# Altium footprint library LimeMicroAltiumLib_pcbLib_r01.PcbLib: 434 footprints (part 4 of 29)
Each footprint in its own frame and in the unit in brackets; x right, y up, seen from the top. Pads: shape width x height; smd on the part's side, far side on the other; paste and mask are expansions set on the pad; w line width, h text height; cw(c..) or ccw(c..) is an arc to the next point about the centre after c.
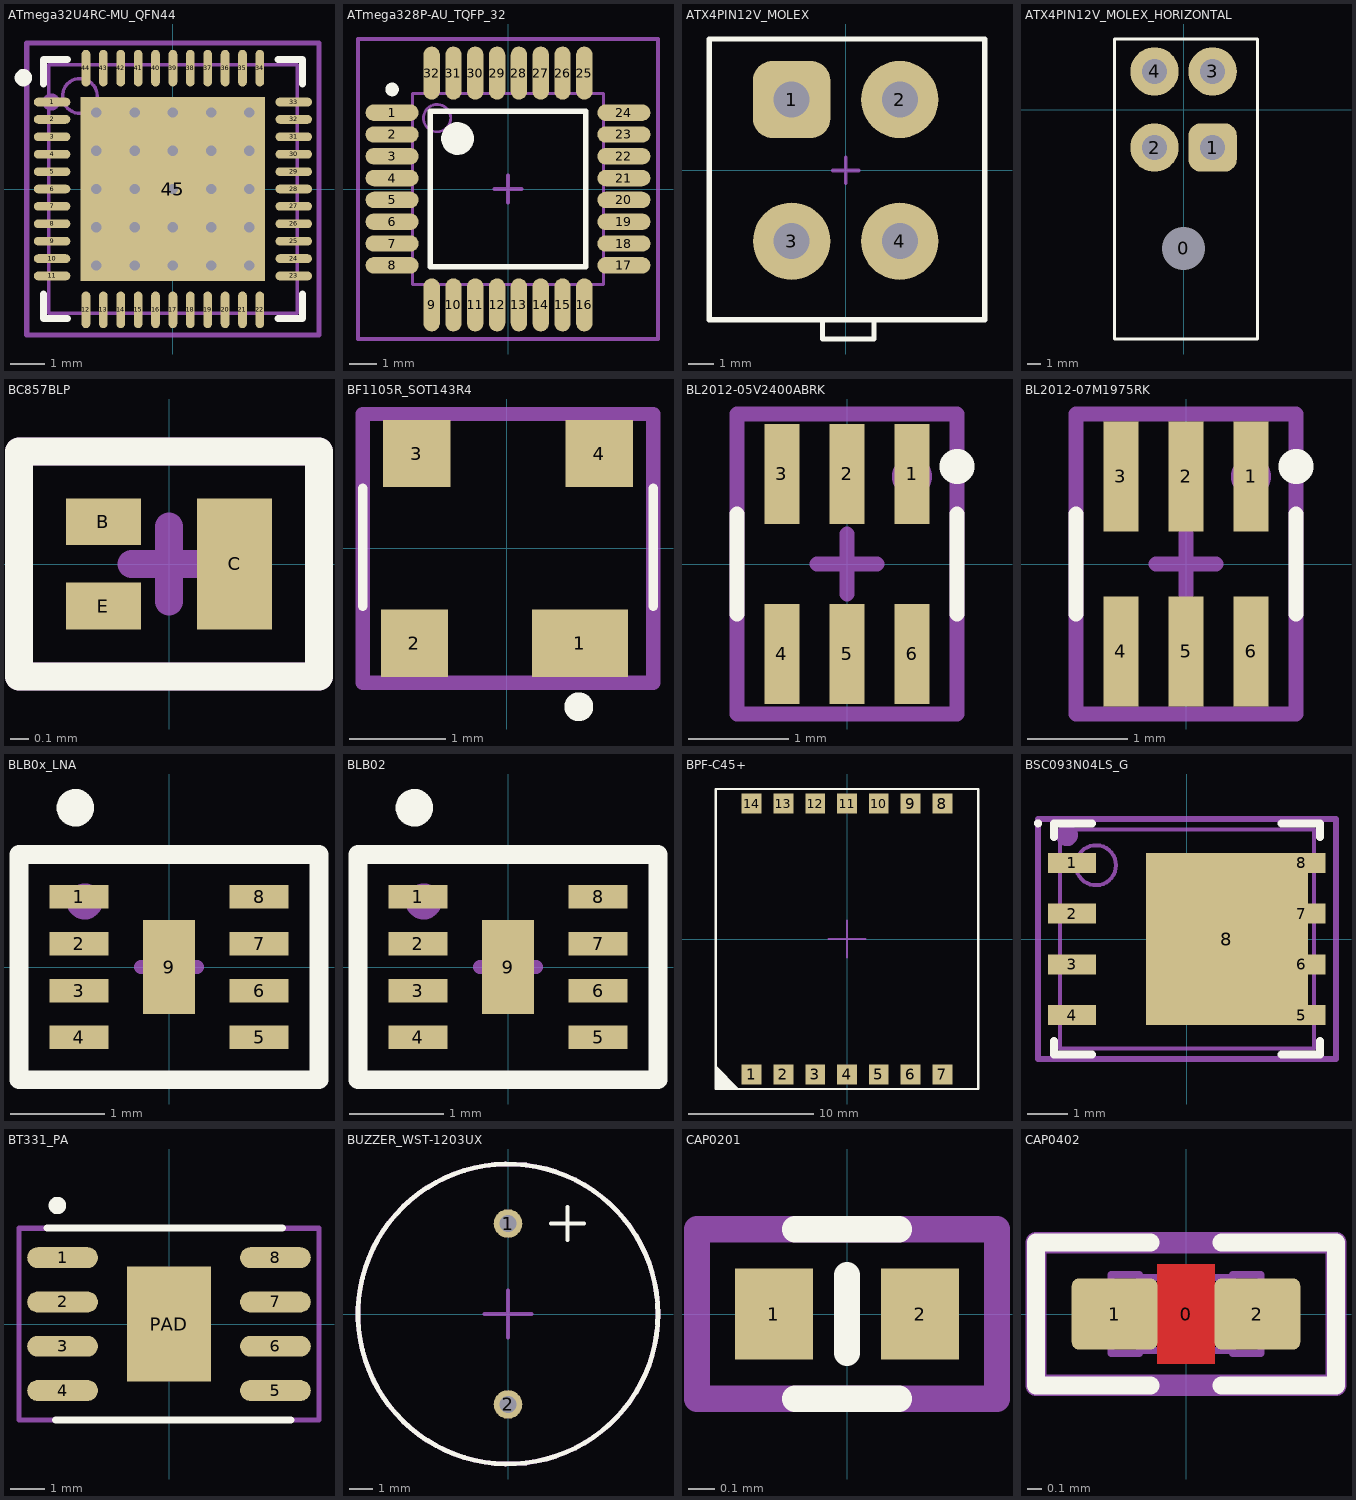
[diagram p3: the footprints below, top view; thin cyan lines are the x and y axes]

## ATmega32U4RC-MU_QFN44 [mm] "QFN, 44-Leads, Body 7x7mm, Pitch 0.5mm, Thermal Pad 5.3x5.3mm, IPC Low Density"
height 0.9
pads (45):
  oval 1.05x0.25 smd mask+0.05: 1(-3.475,2.5) 2(-3.475,2) 3(-3.475,1.5) 4(-3.475,1) 5(-3.475,0.5) 6(-3.475,0) 7(-3.475,-0.5) 8(-3.475,-1) 9(-3.475,-1.5) 10(-3.475,-2) 11(-3.475,-2.5) 23(3.475,-2.5) 24(3.475,-2) 25(3.475,-1.5) 26(3.475,-1) 27(3.475,-0.5) 28(3.475,0) 29(3.475,0.5) 30(3.475,1) 31(3.475,1.5) 32(3.475,2) 33(3.475,2.5)
  oval 0.25x1.05 smd mask+0.05: 12(-2.5,-3.475) 13(-2,-3.475) 14(-1.5,-3.475) 15(-1,-3.475) 16(-0.5,-3.475) 17(0,-3.475) 18(0.5,-3.475) 19(1,-3.475) 20(1.5,-3.475) 21(2,-3.475) 22(2.5,-3.475) 34(2.5,3.475) 35(2,3.475) 36(1.5,3.475) 37(1,3.475) 38(0.5,3.475) 39(0,3.475) 40(-0.5,3.475) 41(-1,3.475) 42(-1.5,3.475) 43(-2,3.475) 44(-2.5,3.475)
  rect 5.3x5.3 smd mask+0.05: 45(0,0)
via 2.2,-2.2 diameter 0.6 hole 0.3
via 1.1,-2.2 diameter 0.6 hole 0.3
via 0,-2.2 diameter 0.6 hole 0.3
via -1.1,-2.2 diameter 0.6 hole 0.3
via -2.2,-2.2 diameter 0.6 hole 0.3
via 2.2,-1.1 diameter 0.6 hole 0.3
via 1.1,-1.1 diameter 0.6 hole 0.3
via 0,-1.1 diameter 0.6 hole 0.3
via -1.1,-1.1 diameter 0.6 hole 0.3
via -2.2,-1.1 diameter 0.6 hole 0.3
via 2.2,0 diameter 0.6 hole 0.3
via 1.1,0 diameter 0.6 hole 0.3
via 0,0 diameter 0.6 hole 0.3
via -1.1,0 diameter 0.6 hole 0.3
via -2.2,0 diameter 0.6 hole 0.3
via 2.2,1.1 diameter 0.6 hole 0.3
via 1.1,1.1 diameter 0.6 hole 0.3
via 0,1.1 diameter 0.6 hole 0.3
via -1.1,1.1 diameter 0.6 hole 0.3
via -2.2,1.1 diameter 0.6 hole 0.3
via 2.2,2.2 diameter 0.6 hole 0.3
via 1.1,2.2 diameter 0.6 hole 0.3
via 0,2.2 diameter 0.6 hole 0.3
via -1.1,2.2 diameter 0.6 hole 0.3
via -2.2,2.2 diameter 0.6 hole 0.3
Top Overlay:
  circle w0.25: c-4.3,3.2 r0.125
  lines w0.2: -3.725,-3.025 -3.725,-3.725 -3.025,-3.725 ; -3.725,3.025 -3.725,3.725 -3.025,3.725 ; 3.025,-3.725 3.725,-3.725 3.725,-3.025 ; 3.025,3.725 3.725,3.725 3.725,3.025
Mechanical 13:
  circle w0.1: c-2.675,2.675 r0.5
  lines w0.1: -3.575,-3.575 3.575,-3.575 3.575,3.575 -3.575,3.575 -3.575,-3.575
Mechanical 15:
  circle w0.3: c-3.5,2.5 r0.1
  lines w0.15: -0.5,0 0.5,0 ; 0,-0.5 0,0.5 ; -4.2,-4.2 4.2,-4.2 4.2,4.2 -4.2,4.2 -4.2,-4.2
  text ".Designator" at 0,0 h0.55
3D body "User Library-QFN 44.step": height 0.8, standoff -0.05, extent -3.501,-3.501 3.501,3.501

## ATmega328P-AU_TQFP_32 [mm] "Thin QFP, 32-Leads, Body 7x7mm, Pitch 0.8mm, IPC Low Density"
height 1.2
pads (32):
  oval 1.95x0.6 smd mask+0.05: 1(-4.25,2.8) 2(-4.25,2) 3(-4.25,1.2) 4(-4.25,0.4) 5(-4.25,-0.4) 6(-4.25,-1.2) 7(-4.25,-2) 8(-4.25,-2.8) 17(4.25,-2.8) 18(4.25,-2) 19(4.25,-1.2) 20(4.25,-0.4) 21(4.25,0.4) 22(4.25,1.2) 23(4.25,2) 24(4.25,2.8)
  oval 0.6x1.95 smd mask+0.05: 9(-2.8,-4.25) 10(-2,-4.25) 11(-1.2,-4.25) 12(-0.4,-4.25) 13(0.4,-4.25) 14(1.2,-4.25) 15(2,-4.25) 16(2.8,-4.25) 25(2.8,4.25) 26(2,4.25) 27(1.2,4.25) 28(0.4,4.25) 29(-0.4,4.25) 30(-1.2,4.25) 31(-2,4.25) 32(-2.8,4.25)
Top Overlay:
  circle w0.6: c-1.85,1.85 r0.3
  circle w0.25: c-4.25,3.65 r0.125
  lines w0.2: -2.85,-2.85 2.85,-2.85 2.85,2.85 -2.85,2.85 -2.85,-2.85
Mechanical 13:
  circle w0.1: c-2.6,2.6 r0.5
  lines w0.1: -3.5,-3.5 3.5,-3.5 3.5,3.5 -3.5,3.5 -3.5,-3.5
Mechanical 15:
  circle w0.3: c-4.25,2.75 r0.112
  lines w0.15: -0.5,0 0.5,0 ; 0,-0.5 0,0.5 ; -5.5,-5.5 5.5,-5.5 5.5,5.5 -5.5,5.5 -5.5,-5.5
  text ".Designator" at 0,0 h0.55
3D body "User Library-TQFP32-4.step": height 1.1, standoff -0.05, extent -4.512,-4.512 4.512,4.512

## ATX4PIN12V_MOLEX [mm]
pads (4):
  rrect50% 3x3 hole 1.4: 1(-2.1,2.75)
  round 3 hole 1.4: 2(2.1,2.75) 3(-2.1,-2.75) 4(2.1,-2.75)
Top Overlay:
  lines w0.2: -0.9,-5.85 -0.9,-6.55 1.1,-6.55 1.1,-5.85 ; -5.3,-5.8 -5.3,5.1 5.4,5.1 5.4,-5.8 -5.3,-5.8
Mechanical 15:
  lines w0.15: -0.9,-5.85 -0.9,-6.55 1.1,-6.55 1.1,-5.85 ; -0.5,0 0.5,0 ; 0,-0.5 0,0.5 ; -5.3,-5.8 5.4,-5.8 5.4,5.1 -5.3,5.1 -5.3,-5.8
  text ".Designator" at 0,0.025 h0.55
3D body "039281043.stp": height 12.8, standoff -3.5, extent -5.2,-6 5.2,5

## ATX4PIN12V_MOLEX_HORIZONTAL [mm]
pads (5):
  round 3 hole 3.1: 0(0,-10.05)
  rrect50% 3.5x3.5 hole 1.8: 1(2.1,-2.75)
  round 3.5 hole 1.8: 2(-2.1,-2.75) 3(2.1,2.75) 4(-2.1,2.75)
Top Overlay:
  lines w0.2: -5,-16.6 -5,5.1 5.35,5.1 5.35,-16.6 -5,-16.6
Mechanical 15:
  lines w0.15: -5,-16.6 5.35,-16.6 5.35,5.1 -5,5.1 -5,-16.6
  text ".Designator" at -0.1,-0.25 h0.55
3D body "039301041.stp": height 11.4, standoff -3.6, extent -4.8,-16.668 5.2,3.268

## BC857BLP [mm]
pads (3):
  rect 0.4x0.25 smd mask+0.05: B(-0.35,0.225) E(-0.35,-0.225)
  rect 0.4x0.7 smd mask+0.05: C(0.35,0)
Top Overlay:
  lines w0.15: -0.8,-0.6 -0.8,0.6 0.8,0.6 0.8,-0.6 -0.8,-0.6
Mechanical 15:
  lines w0.15: -0.2,0 0.2,0 ; 0,-0.2 0,0.2 ; -0.8,-0.6 0.8,-0.6 0.8,0.6 -0.8,0.6 -0.8,-0.6
  text ".Designator" at 0,0 h0.55
3D body: height 0.5, standoff 0, extent -0.5,-0.3 0.5,0.3

## BF1105R_SOT143R4 [mm] "RF MOSFET Transistors Trans MOSFET N-CH 7V 0.03A 4pin(3+Tab). SOT-143R-4 package"
pads (4):
  rect 1x0.7 smd: 1(0.763,-0.987)
  rect 0.7x0.7 smd: 2(-0.962,-0.987) 3(-0.937,0.988) 4(0.963,0.988)
Top Overlay:
  circle w0.15: c0.75,-1.65 r0.075
  lines w0.1: -1.5,-0.6 -1.5,0.625 ; 1.525,-0.6 1.525,0.625
Mechanical 15:
  circle w0.15: c0.75,-0.975 r0.056
  lines w0.15: -1.5,-1.4 1.525,-1.4 1.525,1.4 -1.5,1.4 -1.5,-1.4
  text ".Designator" at 0,0 h0.55
3D body "User Library-SOT143R.STEP": height 0.95, standoff 0.02, extent -1.438,-1.262 1.463,1.238

## BL2012-05V2400ABRK [mm]
pads (6):
  rect 0.35x1 smd mask+0.05: 1(0.65,0.9) 2(0,0.9) 3(-0.65,0.9) 4(-0.65,-0.9) 5(0,-0.9) 6(0.65,-0.9)
Top Overlay:
  circle w0.3: c1.1,0.975 r0.025
  lines w0.15: -1.1,-0.5 -1.1,0.5 ; 1.1,-0.5 1.1,0.5
Mechanical 15:
  circle w0.3: c0.65,0.875 r0.05
  lines w0.15: -0.3,0 0.3,0 ; 0,-0.3 0,0.3 ; -1.1,-1.5 1.1,-1.5 1.1,1.5 -1.1,1.5 -1.1,-1.5
  text ".Designator" at 0,0 h0.55
3D body: height 0.96, standoff 0, extent 0.5,-1.037 0.8,-0.725
3D body: height 0.96, standoff 0, extent -0.15,-1.037 0.15,-0.725
3D body: height 0.96, standoff 0, extent -0.8,-1.037 -0.5,-0.725
3D body: height 0.96, standoff 0, extent -0.8,0.725 -0.5,1.037
3D body: height 0.96, standoff 0, extent -0.15,0.725 0.15,1.037
3D body: height 0.96, standoff 0, extent 0.4,-0.2 0.8,0.2
3D body: height 0.96, standoff 0, extent 0.5,0.725 0.8,1.037
3D body: height 0.95, standoff 0, extent -1,-1 1,1

## BL2012-07M1975RK [mm]
pads (6):
  rect 0.35x1.1 smd mask+0.05: 1(0.65,0.875) 2(0,0.875) 3(-0.65,0.875) 4(-0.65,-0.875) 5(0,-0.875) 6(0.65,-0.875)
Top Overlay:
  circle w0.3: c1.1,0.975 r0.025
  lines w0.15: -1.1,-0.5 -1.1,0.5 ; 1.1,-0.5 1.1,0.5
Mechanical 15:
  circle w0.3: c0.65,0.875 r0.05
  lines w0.15: -0.3,0 0.3,0 ; 0,-0.3 0,0.3 ; -1.1,-1.5 1.1,-1.5 1.1,1.5 -1.1,1.5 -1.1,-1.5
  text ".Designator" at 0,0 h0.55
3D body: height 0.96, standoff 0, extent 0.338,-0.125 0.613,0.125
3D body: height 0.96, standoff 0, extent 0.5,0.512 0.8,0.637
3D body: height 0.96, standoff 0, extent -0.8,0.513 -0.5,0.638
3D body: height 0.96, standoff 0, extent -0.15,0.512 0.15,0.637
3D body: height 0.96, standoff 0, extent 0.5,-0.637 0.8,-0.512
3D body: height 0.96, standoff 0, extent -0.15,-0.637 0.15,-0.512
3D body: height 0.96, standoff 0, extent -0.8,-0.637 -0.5,-0.512
3D body: height 0.95, standoff 0, extent -1,-0.625 1,0.625

## BLB0x_LNA [mm] "BLB01 and BLB02 footprint"
pads (9):
  rect 0.625x0.25 smd mask+0.05: 1(-0.96,0.75) 2(-0.96,0.25) 3(-0.96,-0.25) 4(-0.96,-0.75) 5(0.96,-0.75) 6(0.96,-0.25) 7(0.96,0.25) 8(0.96,0.75)
  rect 0.56x1 smd mask+0.05: 9(0,0)
Top Overlay:
  circle w0.2: c-1,1.7 r0.1
  lines w0.2: -1.6,-1.2 1.6,-1.2 1.6,1.2 -1.6,1.2 -1.6,-1.2
Mechanical 15:
  circle w0.254: c-0.9,0.7 r0.064
  lines w0.15: -0.3,0 0.3,0 ; 0,-0.3 0,0.3 ; -1.6,-1.2 -1.6,1.2 1.6,1.2 1.6,-1.2 -1.6,-1.2
  text ".Designator" at 0,0 h0.55
3D body: height 0.6, standoff 0, extent -1.1,-1.1 1.1,1.1
3D body: height 0.61, standoff 0, extent -0.949,0.65 -0.65,0.95

## BLB02 [mm]
pads (9):
  rect 0.625x0.25 smd mask+0.05: 1(-0.96,0.75) 2(-0.96,0.25) 3(-0.96,-0.25) 4(-0.96,-0.75) 5(0.96,-0.75) 6(0.96,-0.25) 7(0.96,0.25) 8(0.96,0.75)
  rect 0.56x1 smd mask+0.05: 9(0,0)
Top Overlay:
  circle w0.2: c-1,1.7 r0.1
  lines w0.2: -1.6,-1.2 1.6,-1.2 1.6,1.2 -1.6,1.2 -1.6,-1.2
Mechanical 15:
  circle w0.254: c-0.9,0.7 r0.064
  lines w0.15: -0.3,0 0.3,0 ; 0,-0.3 0,0.3 ; -1.6,-1.2 -1.6,1.2 1.6,1.2 1.6,-1.2 -1.6,-1.2
  text ".Designator" at 0,0 h0.55
3D body: height 0.6, standoff 0, extent -1.1,-1.1 1.1,1.1
3D body: height 0.61, standoff 0, extent -0.949,0.65 -0.65,0.95

## BPF-C45+ [mm]
height 6.35
pads (14):
  rect 1.6x1.6 smd mask+0.05: 1(-7.62,-10.83) 2(-5.08,-10.83) 3(-2.54,-10.83) 4(0,-10.83) 5(2.54,-10.83) 6(5.08,-10.83) 7(7.62,-10.83) 8(7.62,10.83) 9(5.08,10.83) 10(2.54,10.83) 11(0,10.83) 12(-2.54,10.83) 13(-5.08,10.83) 14(-7.62,10.83)
Top Overlay:
  region: -10.5,-10.1 -10.5,-12 -8.6,-12
  lines w0.2: -10.5,-12 -10.5,12 10.5,12 10.5,-12 -10.5,-12
Mechanical 15:
  circle w0.3: c-7.6,-10.8 r0.141
  lines w0.15: -1.5,0 0,0 ; 0,-1.5 0,0 ; 0,1.5 0,0 ; 1.5,0 0,0 ; -10.5,-12 10.5,-12 10.5,12 -10.5,12 -10.5,-12
  text ".Designator" at 0,0 h0.55
3D body: height 6.35, standoff 0, extent -10.15,-11.05 10.15,11.05

## BSC093N04LS_G [mm] "SON, 8-Leads, Body 5,32x6,15mm, Pitch 1,27mm, Thermal Pad 3,60x4,05mm, IPC Medium Density"
height 1.1
pads (9):
  rect 1.2x0.5 smd: 1(-2.87,1.905) 2(-2.87,0.635) 3(-2.87,-0.635) 4(-2.87,-1.905) 5(2.87,-1.905) 6(2.87,-0.635) 7(2.87,0.635) 8(2.87,1.905)
  rect 4.05x4.3 smd paste-2.025: 8(1,0)
Top Overlay:
  circle w0.1: c-3.725,2.895 r0.05
  lines w0.2: -3.325,-2.555 -3.325,-2.895 -2.37,-2.895 ; -3.325,2.555 -3.325,2.895 -2.37,2.895 ; 2.37,-2.895 3.325,-2.895 3.325,-2.555 ; 2.37,2.895 3.325,2.895 3.325,2.555
Mechanical 13:
  circle w0.1: c-2.275,1.845 r0.5
  lines w0.1: -3.175,-2.745 3.175,-2.745 3.175,2.745 -3.175,2.745 -3.175,-2.745
Mechanical 15:
  circle w0.35: c-3,2.6 r0.1
  lines w0.15: -0.5,0 0.5,0 ; 0,-0.5 0,0.5 ; -3.73,-3 3.73,-3 3.73,3 -3.73,3 -3.73,-3
  text ".Designator" at 0,0 h0.55
3D body: height 1.1, standoff 0.2, extent -3.175,-2.745 3.175,2.745

## BT331_PA [mm] "Berex BT331 RF PA"
pads (9):
  oval 2.03x0.6 smd mask+0.05: 1(-3.05,1.905) 2(-3.05,0.635) 3(-3.05,-0.635) 4(-3.05,-1.905) 5(3.05,-1.905) 6(3.05,-0.635) 7(3.05,0.635) 8(3.05,1.905)
  rect 2.41x3.3 smd mask+0.05: PAD(0,0)
Top Overlay:
  circle w0.3: c-3.2,3.4 r0.1
  lines w0.2: -3.5,2.75 3.25,2.75 ; -3.25,-2.75 3.5,-2.75
Mechanical 15:
  circle w0.3: c-3.15,1.925 r0.103
  lines w0.15: -0.5,0 0.5,0 ; 0,-0.5 0,0.5 ; -4.3,-2.75 4.3,-2.75 4.3,2.75 -4.3,2.75 -4.3,-2.75
  text ".Designator" at 0,0 h0.55
3D body "SOIC-8.STEP": height 1.75, standoff 0, extent -3,-2.45 3,2.45

## BUZZER_WST-1203UX [mm]
pads (2):
  round 1.2 hole 0.7 mask+0.05: 1(0,3.8) 2(0,-3.8)
Top Overlay:
  circle w0.2: c0,0 r6.3
  lines w0.15: 1.8,3.8 3.2,3.8 ; 2.5,3.1 2.5,4.5
Mechanical 15:
  circle w0.2: c0,0 r6.301
  lines w0.15: -1,0 0,0 ; 0,-1 0,0 ; 0,1 0,0 ; 1,0 0,0
  text ".Designator" at 0,0 h0.55
  text "positive (longer pin)" at -5.3,2.4 h0.55
3D body "User Library-WST-1203UX.step": height 9.65, standoff -4.5, extent -6,-6.027 6,9.427

## CAP0201 [mm]
pads (2):
  rect 0.3x0.35 smd mask+0.05: 1(-0.28,0) 2(0.28,0)
Top Overlay:
  lines w0.1: -0.2,-0.325 0.2,-0.325 ; -0.2,0.325 0.2,0.325 ; 0,-0.15 0,0.15
Mechanical 15:
  circle w0.05: c0,0 r0.025
  lines w0.1: -0.575,-0.325 -0.575,0.325 0.575,0.325 0.575,-0.325 -0.575,-0.325
  text ".Designator" at 0,0 h0.55
3D body: height 0.25, standoff 0, extent 0.17,-0.15 0.3,0.15
3D body: height 0.25, standoff 0, extent -0.3,-0.15 -0.17,0.15
3D body: height 0.25, standoff 0, extent -0.17,-0.15 0.17,0.15

## CAP0402 [mm] "Chip Capacitor, Body 1.0x0.5mm, 0402, IPC Medium Density"
height 0.55
pads (3):
  round 0.2 on Mech15: 0(0,0)
  rrect20% 0.6x0.5 smd: 1(-0.5,0) 2(0.5,0)
Top Layer:
  pour cut-out: -0.2,0.35 0.2,0.35 0.2,-0.35 -0.2,-0.35
Top Overlay:
  lines w0.127: -0.25,-0.5 -1.05,-0.5 -1.05,0.5 -0.25,0.5 ; 0.25,-0.5 1.05,-0.5 1.05,0.5 0.25,0.5
Mechanical 13:
  lines w0.05: -0.325,-0.255 0.325,-0.255 ; -0.325,0.255 0.325,0.255 ; -0.525,-0.275 -0.525,0.275 -0.325,0.275 -0.325,-0.275 -0.525,-0.275 ; 0.325,-0.275 0.525,-0.275 0.525,0.275 0.325,0.275 0.325,-0.275
Mechanical 15:
  lines w0.15: -1.05,-0.5 -1.05,0.5 1.05,0.5 1.05,-0.5 -1.05,-0.5
  text ".Designator" at 0,0 h0.55
3D body "CAP 0402 (1005 metric).STEP": height 0.55, standoff 0, extent -0.525,-0.275 0.525,0.275